# Altium footprint library Connectors.PcbLib: 199 footprints (part 13 of 13)
Each footprint in its own frame and in the unit in brackets; x right, y up, seen from the top. Pads: shape width x height; smd on the part's side, far side on the other; paste and mask are expansions set on the pad; w line width, h text height; cw(c..) or ccw(c..) is an arc to the next point about the centre after c.
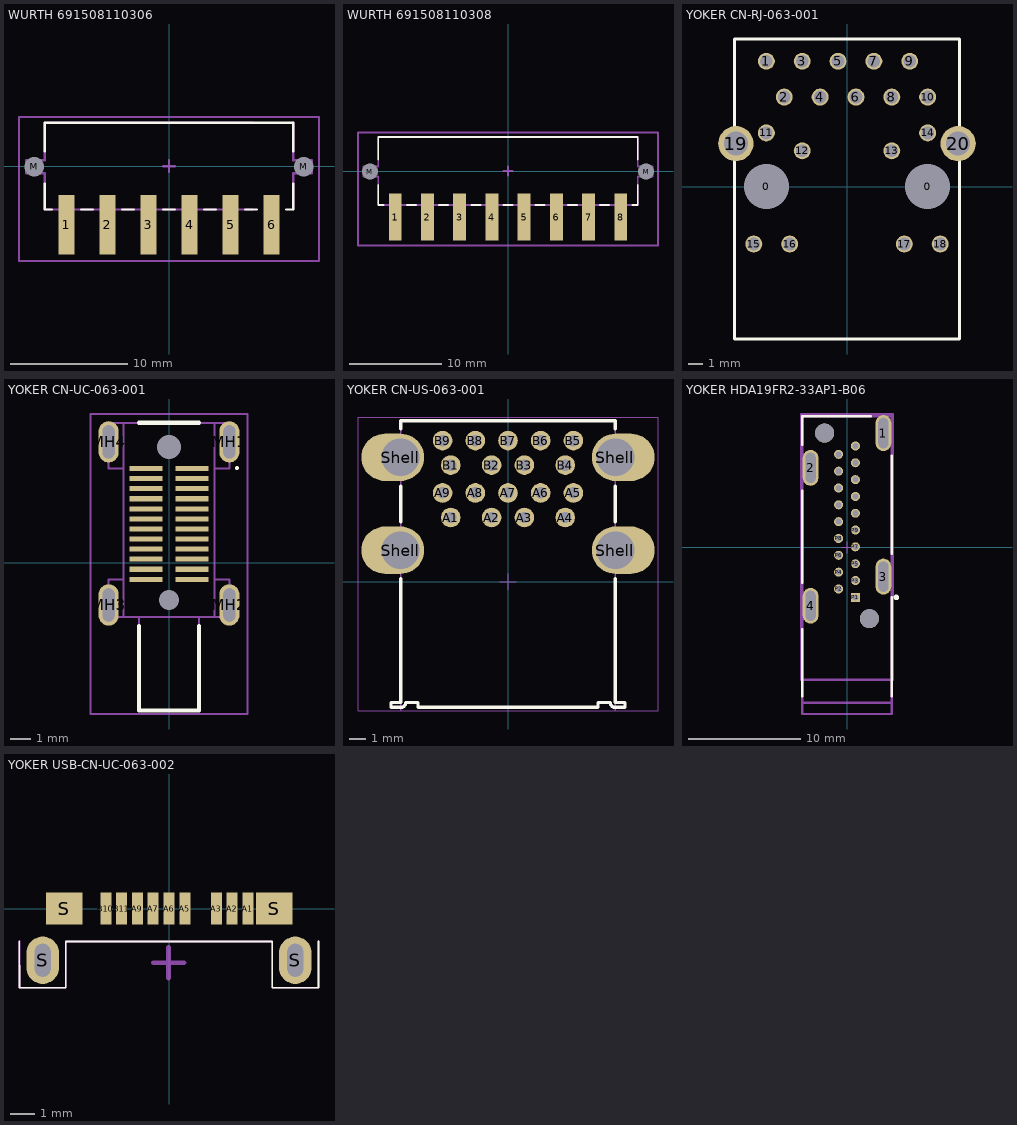
[diagram p12: the footprints below, top view; thin cyan lines are the x and y axes]

## WURTH 691508110306 [mm]
height 11.2
pads (8):
  rect 1.4x5.1 smd: 1(-8.75,-5) 2(-5.25,-5) 3(-1.75,-5) 4(1.75,-5) 5(5.25,-5) 6(8.75,-5)
  round 1 hole 1.7 unplated: M(-11.5,-0.05) M(11.5,-0.05)
Top Overlay:
  lines w0.2: -10.6,-1.5 -10.6,-3.7 -10,-3.7 ; -10.6,1.25 -10.6,3.7 10.6,3.7 10.6,1.25 ; -7.5,-3.7 -6.5,-3.7 ; -4,-3.7 -3,-3.7 ; -0.5,-3.7 0.5,-3.7 ; 3,-3.7 4,-3.7 ; 6.5,-3.7 7.5,-3.7 ; 10,-3.7 10.6,-3.7 10.6,-1.5
Mechanical 1:
  lines w0.2: 7.1,-3.7 -10.6,-3.7 -10.6,-0.6 -12.2,-0.6 -12.2,0.5 -10.6,0.5 -10.6,3.7 7.1,3.7 ; 10.6,-3.7 10.6,-0.6 12.2,-0.6 12.2,0.5 10.6,0.5 10.6,3.7
Mechanical 15:
  lines w0.2: -0.5,0 0.5,0 ; 0,-0.5 0,0.5 ; -12.8,-8.1 12.8,-8.1 12.8,4.2 -12.8,4.2 -12.8,-8.1
3D body "Wurth 691508110306.STEP": height 11.2, standoff -2, extent -12.175,-7.2 12.175,3.7

## WURTH 691508110308 [mm]
height 11.2
pads (10):
  rect 1.4x5.1 smd: 1(-12.25,-5) 2(-8.75,-5) 3(-5.25,-5) 4(-1.75,-5) 5(1.75,-5) 6(5.25,-5) 7(8.75,-5) 8(12.25,-5)
  round 1 hole 1.7 unplated: M(-15,-0.05) M(15,-0.05)
Top Overlay:
  lines w0.2: -14.1,-1.5 -14.1,-3.7 -13.5,-3.7 ; -14.1,1.25 -14.1,3.7 14.1,3.7 14.1,1.25 ; -11,-3.7 -10,-3.7 ; -7.5,-3.7 -6.5,-3.7 ; -4,-3.7 -3,-3.7 ; -0.5,-3.7 0.5,-3.7 ; 3,-3.7 4,-3.7 ; 6.5,-3.7 7.5,-3.7 ; 10,-3.7 11,-3.7 ; 13.5,-3.7 14.1,-3.7 14.1,-1.5
Mechanical 1:
  lines w0.2: -15.7,-0.6 -15.7,0.5 -14.1,0.5 -14.1,3.7 14.1,3.7 14.1,0.5 15.7,0.5 15.7,-0.6 14.1,-0.6 14.1,-3.7 -14.1,-3.7 -14.1,-0.6 -15.7,-0.6
Mechanical 15:
  lines w0.2: -0.5,0 0.5,0 ; 0,-0.5 0,0.5 ; -16.3,-8.1 16.3,-8.1 16.3,4.2 -16.3,4.2 -16.3,-8.1
3D body "Wurth 691508110308.STEP": height 11.2, standoff -2, extent -15.675,-7.2 15.675,3.7

## YOKER CN-RJ-063-001 [mm] "RJ45 Integrated Magnetics PoE"
pads (22):
  round 1 hole 3.2: 0(-5.715,0) 0(5.715,0)
  round 1.2 hole 0.9: 1(-5.715,8.89) 2(-4.445,6.35) 3(-3.175,8.89) 4(-1.905,6.35) 5(-0.635,8.89) 6(0.635,6.35) 7(1.905,8.89) 8(3.175,6.35) 9(4.445,8.89) 10(5.715,6.35) 11(-5.715,3.81) 12(-3.175,2.54) 13(3.175,2.54) 14(5.715,3.81) 15(-6.604,-4.064) 16(-4.064,-4.064) 17(4.064,-4.064) 18(6.604,-4.064)
  round 2.5 hole 1.7: 19(-7.875,3.05) 20(7.875,3.05)
Top Overlay:
  lines w0.2: -7.976,-10.795 7.976,-10.795 7.976,10.465 -7.976,10.465 -7.976,-10.795
3D body "RJ45 with spring 4.06-10P+POE 1000M with Led .stp": height 13.57, standoff -3.48, extent -8.13,-10.75 8.17,10.85

## YOKER CN-UC-063-001 [mm]
pads (30):
  rect 1.625x0.25 smd: A1(1.138,4.69) A2(1.138,4.19) A3(1.138,3.69) A4(1.138,3.19) A5(1.138,2.69) A6(1.138,2.19) A7(1.138,1.69) A8(1.138,1.19) A9(1.138,0.69) A10(1.138,0.19) A11(1.138,-0.31) A12(1.138,-0.81) B1(-1.137,-0.81) B2(-1.137,-0.31) B3(-1.137,0.19) B4(-1.137,0.69) B5(-1.137,1.19) B6(-1.137,1.69) B7(-1.137,2.19) B8(-1.137,2.69) B9(-1.137,3.19) B10(-1.137,3.69) B11(-1.137,4.19) B12(-1.137,4.69)
  oval 1x2.05 hole 0.6 slot 1.65 at 90 deg: MH1(3,6.015) MH2(3,-2.085) MH3(-3,-2.085) MH4(-3,6.015)
  round 0.6 hole 1.2 unplated: MH5(0,5.765)
  round 0.5 hole 1 unplated: MH6(0,-1.835)
Top Overlay:
  lines w0.1: 3.325,4.715 cw(c3.375,4.715) 3.425,4.715 cw(c3.375,4.715) 3.325,4.715
  lines w0.2: -1.5,-3.135 -1.5,-7.335 1.5,-7.335 1.5,-3.135 ; -1.5,6.965 1.5,6.965
Bottom Assembly:
  lines w0.1: -3.9,-7.5 -3.9,7.4 3.9,7.4 3.9,-7.5 -3.9,-7.5
Top Courtyard:
  lines w0.1: -2.26,-0.81 -3,-0.81 -3,-2.685 -2.26,-2.685 ; -2.26,4.69 -3,4.69 -3,6.965 -2.26,6.965 ; -1.5,-2.685 -1.5,-7.335 1.5,-7.335 1.5,-2.685 ; 2.26,-0.81 3,-0.81 3,-2.085 3,-2.685 2.26,-2.685 ; 2.26,4.69 3,4.69 3,6.965 2.26,6.965 ; -2.26,-2.685 -2.26,6.965 ; -2.26,-2.685 2.26,-2.685 ; -2.26,6.965 2.26,6.965 ; 2.26,-2.685 2.26,6.965
3D body "USB TYPE C 24P Female Flag Type 2row SMT.STEP": height 9.83, standoff -1.7, extent -3.15,-7.36 3.15,6.94

## YOKER CN-US-063-001 [mm] "USB 3.0 Type A Stacked. 2.17mm shorter than normal."
height 15.42
pads (22):
  round 1.2 hole 0.7: A1(-3.5,3.93) A2(-1,3.93) A3(1,3.93) A4(3.5,3.93) A5(4,5.43) A6(2,5.43) A7(0,5.43) A8(-2,5.43) A9(-4,5.43) B1(-3.5,7.13) B2(-1,7.13) B3(1,7.13) B4(3.5,7.13) B5(4,8.63) B6(2,8.63) B7(0,8.63) B8(-2,8.63) B9(-4,8.63)
  oval 3.85x2.9 hole 2.3 copper offset -0.475,0: Shell(-6.57,1.93) Shell(-6.57,7.61)
  oval 3.85x2.9 hole 2.3 copper offset 0.475,0: Shell(6.57,1.93) Shell(6.57,7.61)
Top Overlay:
  lines w0.2: -6.55,0.2 -6.55,-7.375 -7.15,-7.375 -7.15,-7.675 -6.56,-7.675 ccw(c-6.55,-7.375) -6.25,-7.375 -5.5,-7.375 -5.5,-7.675 5.5,-7.675 5.5,-7.375 6.25,-7.375 ccw(c6.55,-7.375) 6.56,-7.675 7.15,-7.675 7.15,-7.375 6.55,-7.375 6.55,0.2 ; -6.55,3.66 -6.55,5.85 ; -6.55,9.35 -6.55,9.85 6.55,9.85 6.55,9.35 ; 6.55,3.66 6.55,5.85
Top Component Outline:
  lines w0.1: -6.55,-7.875 -6.55,9.85 6.55,9.85 6.55,-7.875 ; -6.55,-7.375 -7.15,-7.375 -7.15,-7.675 -6.56,-7.675 ccw(c-6.55,-7.375) -6.25,-7.375 -5.5,-7.375 -5.5,-7.675 5.5,-7.675 5.5,-7.375 6.25,-7.375 ccw(c6.55,-7.375) 6.56,-7.675 7.15,-7.675 7.15,-7.375 6.55,-7.375
Top Courtyard:
  lines w0.05: -0.5,0 0.5,0 ; 0,-0.5 0,0.5 ; -9.17,-7.875 9.17,-7.875 9.17,10.05 -9.17,10.05 -9.17,-7.875
Top 3D Body:
  lines w0.1: -6.55,-7.875 -6.55,9.85 6.55,9.85 6.55,-7.875 ; -6.55,-7.375 -7.15,-7.375 -7.15,-7.675 -6.56,-7.675 ccw(c-6.55,-7.375) -6.25,-7.375 -5.5,-7.375 -5.5,-7.675 5.5,-7.675 5.5,-7.375 6.25,-7.375 ccw(c6.55,-7.375) 6.56,-7.675 7.15,-7.675 7.15,-7.375 6.55,-7.375
Top Designator:
  text ".Designator" at -7.498,-0.5 h1.5
3D body "usb3.0x2 Femla_-1217_asm-2.stp": height 16.08, standoff -4.13, extent -7.751,-7.691 7.735,9.949

## YOKER HDA19FR2-33AP1-B06 [mm]
pads (25):
  rrect100% 1.4x3.2 hole 2.7 slot 0.9 at 0 deg paste-2539.97 mask+0: 1(3.25,10.2) 2(-3.25,7.1) 3(3.25,-2.6) 4(-3.25,-5.2)
  rect 0.8x0.8 hole 0.55 paste-2539.97 mask+0: P1(0.75,-4.45)
  round 0.8 hole 0.55 paste-2539.97 mask+0: P2(-0.75,-3.7) P3(0.75,-2.95) P4(-0.75,-2.2) P5(0.75,-1.45) P6(-0.75,-0.7) P7(0.75,0.05) P8(-0.75,0.8) P9(0.75,1.55) P10(-0.75,2.3) P11(0.75,3.05) P12(-0.75,3.8) P13(0.75,4.55) P14(-0.75,5.3) P15(0.75,6.05) P16(-0.75,6.8) P17(0.75,7.55) P18(-0.75,8.3) P19(0.75,9.05)
  round 1.7 hole 1.7 unplated paste-2539.97 mask+0: ""(-2,10.2) ""(2,-6.35)
Top Overlay:
  circle w0.25: c4.4,-4.45 r0.125
  lines w0.2: -4,-13.3 -4,-7.3 ; -4,-3.175 -4,5.075 ; -4,9.125 -4,11.7 2.125,11.7 ; 4,-13.3 4,-4.45 ; 4,-0.575 4,8.175
Top Assembly:
  lines w0.2: -4.1,-11.8 4.1,-11.8 4.1,11.9 -4.1,11.9 -4.1,-11.8
  text ".Designator" at 0,0.05 h1
Top Courtyard:
  lines w0.2: -4.1,-11.8 4.1,-11.8 4.1,11.9 -4.1,11.9 -4.1,-11.8
Top 3D Body:
  lines w0.2: -4,-13.85 4,-13.85 ; -4,-14.85 4,-14.85 4,11.7 -4,11.7 -4,-14.85
Top Component Center:
  lines w0.1: -0.5,0 0.5,0 ; 0,-0.5 0,0.5
3D body "043-HDMI AF_Flag DIP with Harpoon 2 Row contact  Distance=1.5.stp": height 16.41, standoff -2.82, extent -3.953,-14.8 3.955,11.7

## YOKER USB-CN-UC-063-002 [mm]
height 2.4
pads (13):
  rect 0.45x1.3 smd: A1(3.25,0) A2(2.6,0) A3(1.95,0) A5(0.65,0) A6(0,0) A7(-0.65,0) A9(-1.3,0) B10(-2.6,0) B11(-1.95,0)
  oval 1.35x1.95 hole 0.65 slot 1.35 at 90 deg: S(-5.2,-2.13) S(5.2,-2.13)
  rect 1.5x1.3 smd: S(-4.311,0) S(4.339,0)
Top Overlay:
  lines w0.076: -6.165,-1.36 -6.15,-3.26 -4.25,-3.26 -4.25,-1.36 4.25,-1.36 4.25,-3.26 6.15,-3.26 6.15,-1.36
Mechanical 1:
  lines w0.076: -6.15,-3.26 -4.25,-3.26 -4.25,-1.36 4.25,-1.36 4.25,-3.26 6.15,-3.26 ; -6.15,-3.23 -6.15,-1.33 ; 6.15,-1.341 6.159,-3.26
Mechanical 15:
  lines w0.2: -0.649,-2.234 0.621,-2.234 ; -0.014,-2.869 -0.014,-1.599
3D body "Yoker CN-UC-063-002.STEP": height 1.33, standoff -1.32, extent -5.35,-12.965 5.35,0.33